# Altium footprint library Yaoji.PcbLib: 3 footprints
Each footprint in its own frame and in the unit in brackets; x right, y up, seen from the top. Pads: shape width x height; smd on the part's side, far side on the other; paste and mask are expansions set on the pad; w line width, h text height; cw(c..) or ccw(c..) is an arc to the next point about the centre after c.
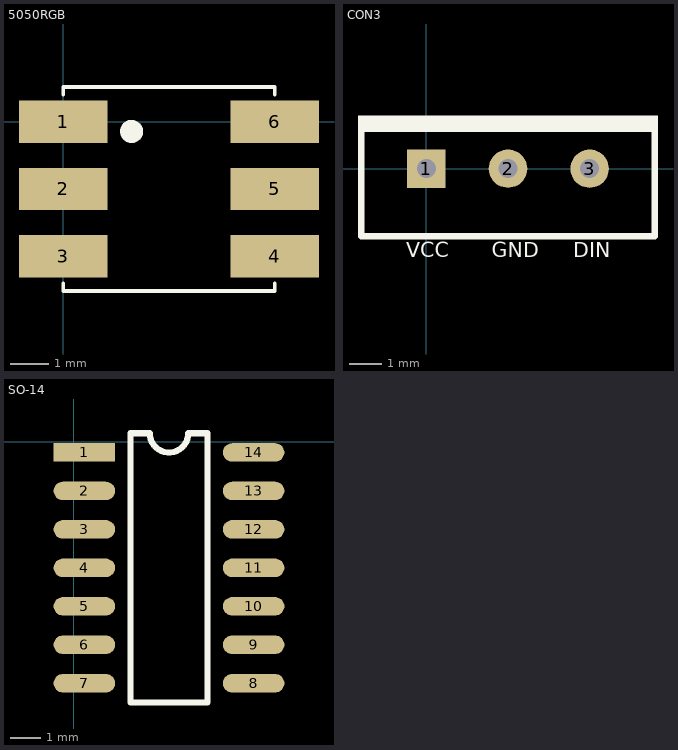
[diagram p0: the footprints below, top view; thin cyan lines are the x and y axes]

## 5050RGB [mm]
pads (6):
  rect 2.3x1.1 smd: 1(0,0) 2(0,-1.75) 3(0,-3.5) 4(5.5,-3.5) 5(5.5,-1.75) 6(5.5,0)
Top Overlay:
  circle w0.3: c1.778,-0.254 r0.15
  lines w0.1: 0,-4.2 0,-4.4 5.5,-4.4 5.5,-4.2 ; 0,0.7 0,0.9 5.5,0.9 5.5,0.7

## CON3 [mm]
pads (3):
  rect 1.2x1.2 hole 0.6: 1(0,0)
  round 1.2 hole 0.6: 2(2.54,0) 3(5.08,0)
Top Overlay:
  rectangle: -2.13,1.143 7.21,1.651
  lines w0.2: -2.03,1.4 -2.03,-2.1 7.11,-2.1 7.11,1.4
  text "VCC" at -0.635,-2.921 h0.8
  text "DIN" at 4.572,-2.921 h0.8
  text "GND" at 2.032,-2.921 h0.8

## SO-14 [mil]
pads (14):
  rect 80x24 smd: 1(14,-14)
  oval 80x24 smd: 2(14,-64) 3(14,-114) 4(14,-164) 5(14,-214) 6(14,-264) 7(14,-314) 8(234,-314) 9(234,-264) 10(234,-214) 11(234,-164) 12(234,-114) 13(234,-64) 14(234,-14)
Top Overlay:
  lines w8: 74,-339 74,11 99,11 ccw(c124,11) 149,11 174,11 174,-339 74,-339